# Altium footprint library con-samtec.PCBLIB: 805 footprints (part 25 of 55)
Each footprint in its own frame and in the unit in brackets; x right, y up, seen from the top. Pads: shape width x height; smd on the part's side, far side on the other; paste and mask are expansions set on the pad; w line width, h text height; cw(c..) or ccw(c..) is an arc to the next point about the centre after c.
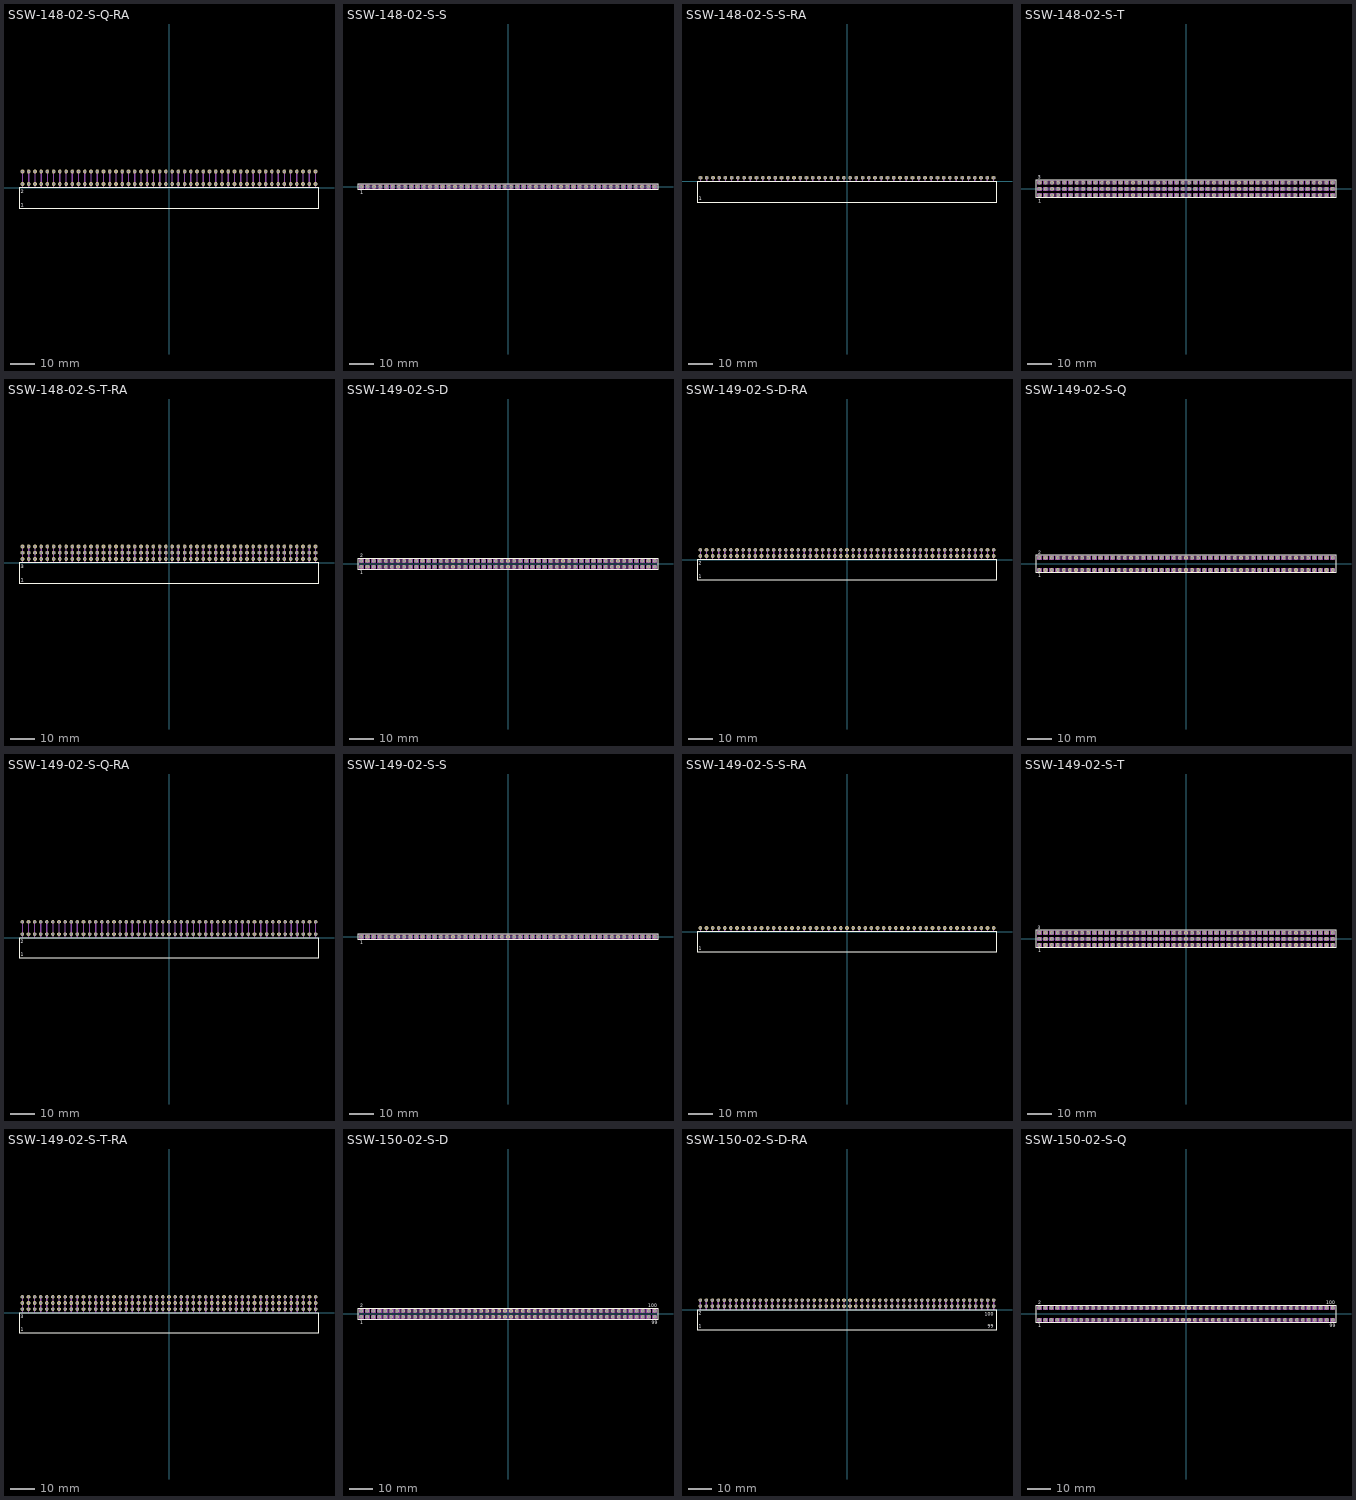
[diagram p24: the footprints below, top view; thin cyan lines are the x and y axes]

## SSW-148-02-S-Q-RA [mil]
pads (96):
  oct 59.06x59.06 hole 39.37: 1(-2350,60) 2(-2350,260) 3(-2250,60) 4(-2250,260) 5(-2150,60) 6(-2150,260) 7(-2050,60) 8(-2050,260) 9(-1950,60) 10(-1950,260) 11(-1850,60) 12(-1850,260) 13(-1750,60) 14(-1750,260) 15(-1650,60) 16(-1650,260) 17(-1550,60) 18(-1550,260) 19(-1450,60) 20(-1450,260) 21(-1350,60) 22(-1350,260) 23(-1250,60) 24(-1250,260) 25(-1150,60) 26(-1150,260) 27(-1050,60) 28(-1050,260) 29(-950,60) 30(-950,260) 31(-850,60) 32(-850,260) 33(-750,60) 34(-750,260) 35(-650,60) 36(-650,260) 37(-550,60) 38(-550,260) 39(-450,60) 40(-450,260) 41(-350,60) 42(-350,260) 43(-250,60) 44(-250,260) 45(-150,60) 46(-150,260) 47(-50,60) 48(-50,260) 49(50,60) 50(50,260) 51(150,60) 52(150,260) 53(250,60) 54(250,260) 55(350,60) 56(350,260) 57(450,60) 58(450,260) 59(550,60) 60(550,260) 61(650,60) 62(650,260) 63(750,60) 64(750,260) 65(850,60) 66(850,260) 67(950,60) 68(950,260) 69(1050,60) 70(1050,260) 71(1150,60) 72(1150,260) 73(1250,60) 74(1250,260) 75(1350,60) 76(1350,260) 77(1450,60) 78(1450,260) 79(1550,60) 80(1550,260) 81(1650,60) 82(1650,260) 83(1750,60) 84(1750,260) 85(1850,60) 86(1850,260) 87(1950,60) 88(1950,260) 89(2050,60) 90(2050,260) 91(2150,60) 92(2150,260) 93(2250,60) 94(2250,260) 95(2350,60) 96(2350,260)
Top Overlay:
  lines w8: -2405.08,-330.55 2405.08,-330.55 2405.08,-4.17 -2405.08,-4.17 -2405.08,-330.55
  text "1" at -2373.43,-301.18 h56.1
  text "2" at -2376.38,-86.61 h56.1
Mechanical 16:
  rectangle: -2360,0 -2340,270
  rectangle: -2260,0 -2240,270
  rectangle: -2160,0 -2140,270
  rectangle: -2060,0 -2040,270
  rectangle: -1960,0 -1940,270
  rectangle: -1860,0 -1840,270
  rectangle: -1760,0 -1740,270
  rectangle: -1660,0 -1640,270
  rectangle: -1560,0 -1540,270
  rectangle: -1460,0 -1440,270
  rectangle: -1360,0 -1340,270
  rectangle: -1260,0 -1240,270
  rectangle: -1160,0 -1140,270
  rectangle: -1060,0 -1040,270
  rectangle: -960,0 -940,270
  rectangle: -860,0 -840,270
  rectangle: -760,0 -740,270
  rectangle: -660,0 -640,270
  rectangle: -560,0 -540,270
  rectangle: -460,0 -440,270
  rectangle: -360,0 -340,270
  rectangle: -260,0 -240,270
  rectangle: -160,0 -140,270
  rectangle: -60,0 -40,270
  rectangle: 40,0 60,270
  rectangle: 140,0 160,270
  rectangle: 240,0 260,270
  rectangle: 340,0 360,270
  rectangle: 440,0 460,270
  rectangle: 540,0 560,270
  rectangle: 640,0 660,270
  rectangle: 740,0 760,270
  rectangle: 840,0 860,270
  rectangle: 940,0 960,270
  rectangle: 1040,0 1060,270
  rectangle: 1140,0 1160,270
  rectangle: 1240,0 1260,270
  rectangle: 1340,0 1360,270
  rectangle: 1440,0 1460,270
  rectangle: 1540,0 1560,270
  rectangle: 1640,0 1660,270
  rectangle: 1740,0 1760,270
  rectangle: 1840,0 1860,270
  rectangle: 1940,0 1960,270
  rectangle: 2040,0 2060,270
  rectangle: 2140,0 2160,270
  rectangle: 2240,0 2260,270
  rectangle: 2340,0 2360,270

## SSW-148-02-S-S [mm]
pads (48):
  oct 1.5x1.5 hole 1: 1(-59.69,0) 2(-57.15,0) 3(-54.61,0) 4(-52.07,0) 5(-49.53,0) 6(-46.99,0) 7(-44.45,0) 8(-41.91,0) 9(-39.37,0) 10(-36.83,0) 11(-34.29,0) 12(-31.75,0) 13(-29.21,0) 14(-26.67,0) 15(-24.13,0) 16(-21.59,0) 17(-19.05,0) 18(-16.51,0) 19(-13.97,0) 20(-11.43,0) 21(-8.89,0) 22(-6.35,0) 23(-3.81,0) 24(-1.27,0) 25(1.27,0) 26(3.81,0) 27(6.35,0) 28(8.89,0) 29(11.43,0) 30(13.97,0) 31(16.51,0) 32(19.05,0) 33(21.59,0) 34(24.13,0) 35(26.67,0) 36(29.21,0) 37(31.75,0) 38(34.29,0) 39(36.83,0) 40(39.37,0) 41(41.91,0) 42(44.45,0) 43(46.99,0) 44(49.53,0) 45(52.07,0) 46(54.61,0) 47(57.15,0) 48(59.69,0)
Top Overlay:
  lines w0.203: -61.089,-1.155 61.089,-1.155 61.089,1.155 -61.089,1.155 -61.089,-1.155
  text "1" at -60.198,-3.048 h1.42
Mechanical 16:
  drawing of 192 lines, arcs and shapes, not listed

## SSW-148-02-S-S-RA [mil]
pads (48):
  oct 59.06x59.06 hole 39.37: 1(-2350,60) 2(-2250,60) 3(-2150,60) 4(-2050,60) 5(-1950,60) 6(-1850,60) 7(-1750,60) 8(-1650,60) 9(-1550,60) 10(-1450,60) 11(-1350,60) 12(-1250,60) 13(-1150,60) 14(-1050,60) 15(-950,60) 16(-850,60) 17(-750,60) 18(-650,60) 19(-550,60) 20(-450,60) 21(-350,60) 22(-250,60) 23(-150,60) 24(-50,60) 25(50,60) 26(150,60) 27(250,60) 28(350,60) 29(450,60) 30(550,60) 31(650,60) 32(750,60) 33(850,60) 34(950,60) 35(1050,60) 36(1150,60) 37(1250,60) 38(1350,60) 39(1450,60) 40(1550,60) 41(1650,60) 42(1750,60) 43(1850,60) 44(1950,60) 45(2050,60) 46(2150,60) 47(2250,60) 48(2350,60)
Top Overlay:
  lines w8: -2405.08,-330.55 2405.08,-330.55 2405.08,-4.17 -2405.08,-4.17 -2405.08,-330.55
  text "1" at -2373.43,-301.18 h56.1
Mechanical 16:
  rectangle: -2360,0 -2340,70
  rectangle: -2260,0 -2240,70
  rectangle: -2160,0 -2140,70
  rectangle: -2060,0 -2040,70
  rectangle: -1960,0 -1940,70
  rectangle: -1860,0 -1840,70
  rectangle: -1760,0 -1740,70
  rectangle: -1660,0 -1640,70
  rectangle: -1560,0 -1540,70
  rectangle: -1460,0 -1440,70
  rectangle: -1360,0 -1340,70
  rectangle: -1260,0 -1240,70
  rectangle: -1160,0 -1140,70
  rectangle: -1060,0 -1040,70
  rectangle: -960,0 -940,70
  rectangle: -860,0 -840,70
  rectangle: -760,0 -740,70
  rectangle: -660,0 -640,70
  rectangle: -560,0 -540,70
  rectangle: -460,0 -440,70
  rectangle: -360,0 -340,70
  rectangle: -260,0 -240,70
  rectangle: -160,0 -140,70
  rectangle: -60,0 -40,70
  rectangle: 40,0 60,70
  rectangle: 140,0 160,70
  rectangle: 240,0 260,70
  rectangle: 340,0 360,70
  rectangle: 440,0 460,70
  rectangle: 540,0 560,70
  rectangle: 640,0 660,70
  rectangle: 740,0 760,70
  rectangle: 840,0 860,70
  rectangle: 940,0 960,70
  rectangle: 1040,0 1060,70
  rectangle: 1140,0 1160,70
  rectangle: 1240,0 1260,70
  rectangle: 1340,0 1360,70
  rectangle: 1440,0 1460,70
  rectangle: 1540,0 1560,70
  rectangle: 1640,0 1660,70
  rectangle: 1740,0 1760,70
  rectangle: 1840,0 1860,70
  rectangle: 1940,0 1960,70
  rectangle: 2040,0 2060,70
  rectangle: 2140,0 2160,70
  rectangle: 2240,0 2260,70
  rectangle: 2340,0 2360,70

## SSW-148-02-S-T [mm]
pads (144):
  oct 1.5x1.5 hole 1: 1(-59.69,-2.54) 2(-59.69,0) 3(-59.69,2.54) 4(-57.15,-2.54) 5(-57.15,0) 6(-57.15,2.54) 7(-54.61,-2.54) 8(-54.61,0) 9(-54.61,2.54) 10(-52.07,-2.54) 11(-52.07,0) 12(-52.07,2.54) 13(-49.53,-2.54) 14(-49.53,0) 15(-49.53,2.54) 16(-46.99,-2.54) 17(-46.99,0) 18(-46.99,2.54) 19(-44.45,-2.54) 20(-44.45,0) 21(-44.45,2.54) 22(-41.91,-2.54) 23(-41.91,0) 24(-41.91,2.54) 25(-39.37,-2.54) 26(-39.37,0) 27(-39.37,2.54) 28(-36.83,-2.54) 29(-36.83,0) 30(-36.83,2.54) 31(-34.29,-2.54) 32(-34.29,0) 33(-34.29,2.54) 34(-31.75,-2.54) 35(-31.75,0) 36(-31.75,2.54) 37(-29.21,-2.54) 38(-29.21,0) 39(-29.21,2.54) 40(-26.67,-2.54) 41(-26.67,0) 42(-26.67,2.54) 43(-24.13,-2.54) 44(-24.13,0) 45(-24.13,2.54) 46(-21.59,-2.54) 47(-21.59,0) 48(-21.59,2.54) 49(-19.05,-2.54) 50(-19.05,0) 51(-19.05,2.54) 52(-16.51,-2.54) 53(-16.51,0) 54(-16.51,2.54) 55(-13.97,-2.54) 56(-13.97,0) 57(-13.97,2.54) 58(-11.43,-2.54) 59(-11.43,0) 60(-11.43,2.54) 61(-8.89,-2.54) 62(-8.89,0) 63(-8.89,2.54) 64(-6.35,-2.54) 65(-6.35,0) 66(-6.35,2.54) 67(-3.81,-2.54) 68(-3.81,0) 69(-3.81,2.54) 70(-1.27,-2.54) 71(-1.27,0) 72(-1.27,2.54) 73(1.27,-2.54) 74(1.27,0) 75(1.27,2.54) 76(3.81,-2.54) 77(3.81,0) 78(3.81,2.54) 79(6.35,-2.54) 80(6.35,0) 81(6.35,2.54) 82(8.89,-2.54) 83(8.89,0) 84(8.89,2.54) 85(11.43,-2.54) 86(11.43,0) 87(11.43,2.54) 88(13.97,-2.54) 89(13.97,0) 90(13.97,2.54) 91(16.51,-2.54) 92(16.51,0) 93(16.51,2.54) 94(19.05,-2.54) 95(19.05,0) 96(19.05,2.54) 97(21.59,-2.54) 98(21.59,0) 99(21.59,2.54) 100(24.13,-2.54) 101(24.13,0) 102(24.13,2.54) 103(26.67,-2.54) 104(26.67,0) 105(26.67,2.54) 106(29.21,-2.54) 107(29.21,0) 108(29.21,2.54) 109(31.75,-2.54) 110(31.75,0) 111(31.75,2.54) 112(34.29,-2.54) 113(34.29,0) 114(34.29,2.54) 115(36.83,-2.54) 116(36.83,0) 117(36.83,2.54) 118(39.37,-2.54) 119(39.37,0) 120(39.37,2.54) 121(41.91,-2.54) 122(41.91,0) 123(41.91,2.54) 124(44.45,-2.54) 125(44.45,0) 126(44.45,2.54) 127(46.99,-2.54) 128(46.99,0) 129(46.99,2.54) 130(49.53,-2.54) 131(49.53,0) 132(49.53,2.54) 133(52.07,-2.54) 134(52.07,0) 135(52.07,2.54) 136(54.61,-2.54) 137(54.61,0) 138(54.61,2.54) 139(57.15,-2.54) 140(57.15,0) 141(57.15,2.54) 142(59.69,-2.54) 143(59.69,0) 144(59.69,2.54)
Top Overlay:
  lines w0.203: -61.089,-3.695 61.089,-3.695 61.089,3.695 -61.089,3.695 -61.089,-3.695
  text "1" at -60.198,-5.588 h1.42
  text "3" at -60.452,4.064 h1.42
Mechanical 16:
  drawing of 576 lines, arcs and shapes, not listed

## SSW-148-02-S-T-RA [mil]
pads (144):
  oct 59.06x59.06 hole 39.37: 1(-2350,60) 2(-2350,160) 3(-2350,260) 4(-2250,60) 5(-2250,160) 6(-2250,260) 7(-2150,60) 8(-2150,160) 9(-2150,260) 10(-2050,60) 11(-2050,160) 12(-2050,260) 13(-1950,60) 14(-1950,160) 15(-1950,260) 16(-1850,60) 17(-1850,160) 18(-1850,260) 19(-1750,60) 20(-1750,160) 21(-1750,260) 22(-1650,60) 23(-1650,160) 24(-1650,260) 25(-1550,60) 26(-1550,160) 27(-1550,260) 28(-1450,60) 29(-1450,160) 30(-1450,260) 31(-1350,60) 32(-1350,160) 33(-1350,260) 34(-1250,60) 35(-1250,160) 36(-1250,260) 37(-1150,60) 38(-1150,160) 39(-1150,260) 40(-1050,60) 41(-1050,160) 42(-1050,260) 43(-950,60) 44(-950,160) 45(-950,260) 46(-850,60) 47(-850,160) 48(-850,260) 49(-750,60) 50(-750,160) 51(-750,260) 52(-650,60) 53(-650,160) 54(-650,260) 55(-550,60) 56(-550,160) 57(-550,260) 58(-450,60) 59(-450,160) 60(-450,260) 61(-350,60) 62(-350,160) 63(-350,260) 64(-250,60) 65(-250,160) 66(-250,260) 67(-150,60) 68(-150,160) 69(-150,260) 70(-50,60) 71(-50,160) 72(-50,260) 73(50,60) 74(50,160) 75(50,260) 76(150,60) 77(150,160) 78(150,260) 79(250,60) 80(250,160) 81(250,260) 82(350,60) 83(350,160) 84(350,260) 85(450,60) 86(450,160) 87(450,260) 88(550,60) 89(550,160) 90(550,260) 91(650,60) 92(650,160) 93(650,260) 94(750,60) 95(750,160) 96(750,260) 97(850,60) 98(850,160) 99(850,260) 100(950,60) 101(950,160) 102(950,260) 103(1050,60) 104(1050,160) 105(1050,260) 106(1150,60) 107(1150,160) 108(1150,260) 109(1250,60) 110(1250,160) 111(1250,260) 112(1350,60) 113(1350,160) 114(1350,260) 115(1450,60) 116(1450,160) 117(1450,260) 118(1550,60) 119(1550,160) 120(1550,260) 121(1650,60) 122(1650,160) 123(1650,260) 124(1750,60) 125(1750,160) 126(1750,260) 127(1850,60) 128(1850,160) 129(1850,260) 130(1950,60) 131(1950,160) 132(1950,260) 133(2050,60) 134(2050,160) 135(2050,260) 136(2150,60) 137(2150,160) 138(2150,260) 139(2250,60) 140(2250,160) 141(2250,260) 142(2350,60) 143(2350,160) 144(2350,260)
Top Overlay:
  lines w8: -2405.08,-330.55 2405.08,-330.55 2405.08,-4.17 -2405.08,-4.17 -2405.08,-330.55
  text "1" at -2373.43,-301.18 h56.1
  text "3" at -2376.38,-86.61 h56.1
Mechanical 16:
  rectangle: -2360,0 -2340,270
  rectangle: -2260,0 -2240,270
  rectangle: -2160,0 -2140,270
  rectangle: -2060,0 -2040,270
  rectangle: -1960,0 -1940,270
  rectangle: -1860,0 -1840,270
  rectangle: -1760,0 -1740,270
  rectangle: -1660,0 -1640,270
  rectangle: -1560,0 -1540,270
  rectangle: -1460,0 -1440,270
  rectangle: -1360,0 -1340,270
  rectangle: -1260,0 -1240,270
  rectangle: -1160,0 -1140,270
  rectangle: -1060,0 -1040,270
  rectangle: -960,0 -940,270
  rectangle: -860,0 -840,270
  rectangle: -760,0 -740,270
  rectangle: -660,0 -640,270
  rectangle: -560,0 -540,270
  rectangle: -460,0 -440,270
  rectangle: -360,0 -340,270
  rectangle: -260,0 -240,270
  rectangle: -160,0 -140,270
  rectangle: -60,0 -40,270
  rectangle: 40,0 60,270
  rectangle: 140,0 160,270
  rectangle: 240,0 260,270
  rectangle: 340,0 360,270
  rectangle: 440,0 460,270
  rectangle: 540,0 560,270
  rectangle: 640,0 660,270
  rectangle: 740,0 760,270
  rectangle: 840,0 860,270
  rectangle: 940,0 960,270
  rectangle: 1040,0 1060,270
  rectangle: 1140,0 1160,270
  rectangle: 1240,0 1260,270
  rectangle: 1340,0 1360,270
  rectangle: 1440,0 1460,270
  rectangle: 1540,0 1560,270
  rectangle: 1640,0 1660,270
  rectangle: 1740,0 1760,270
  rectangle: 1840,0 1860,270
  rectangle: 1940,0 1960,270
  rectangle: 2040,0 2060,270
  rectangle: 2140,0 2160,270
  rectangle: 2240,0 2260,270
  rectangle: 2340,0 2360,270

## SSW-149-02-S-D [mm]
pads (98):
  oct 1.5x1.5 hole 1: 1(-60.96,-1.27) 2(-60.96,1.27) 3(-58.42,-1.27) 4(-58.42,1.27) 5(-55.88,-1.27) 6(-55.88,1.27) 7(-53.34,-1.27) 8(-53.34,1.27) 9(-50.8,-1.27) 10(-50.8,1.27) 11(-48.26,-1.27) 12(-48.26,1.27) 13(-45.72,-1.27) 14(-45.72,1.27) 15(-43.18,-1.27) 16(-43.18,1.27) 17(-40.64,-1.27) 18(-40.64,1.27) 19(-38.1,-1.27) 20(-38.1,1.27) 21(-35.56,-1.27) 22(-35.56,1.27) 23(-33.02,-1.27) 24(-33.02,1.27) 25(-30.48,-1.27) 26(-30.48,1.27) 27(-27.94,-1.27) 28(-27.94,1.27) 29(-25.4,-1.27) 30(-25.4,1.27) 31(-22.86,-1.27) 32(-22.86,1.27) 33(-20.32,-1.27) 34(-20.32,1.27) 35(-17.78,-1.27) 36(-17.78,1.27) 37(-15.24,-1.27) 38(-15.24,1.27) 39(-12.7,-1.27) 40(-12.7,1.27) 41(-10.16,-1.27) 42(-10.16,1.27) 43(-7.62,-1.27) 44(-7.62,1.27) 45(-5.08,-1.27) 46(-5.08,1.27) 47(-2.54,-1.27) 48(-2.54,1.27) 49(0,-1.27) 50(0,1.27) 51(2.54,-1.27) 52(2.54,1.27) 53(5.08,-1.27) 54(5.08,1.27) 55(7.62,-1.27) 56(7.62,1.27) 57(10.16,-1.27) 58(10.16,1.27) 59(12.7,-1.27) 60(12.7,1.27) 61(15.24,-1.27) 62(15.24,1.27) 63(17.78,-1.27) 64(17.78,1.27) 65(20.32,-1.27) 66(20.32,1.27) 67(22.86,-1.27) 68(22.86,1.27) 69(25.4,-1.27) 70(25.4,1.27) 71(27.94,-1.27) 72(27.94,1.27) 73(30.48,-1.27) 74(30.48,1.27) 75(33.02,-1.27) 76(33.02,1.27) 77(35.56,-1.27) 78(35.56,1.27) 79(38.1,-1.27) 80(38.1,1.27) 81(40.64,-1.27) 82(40.64,1.27) 83(43.18,-1.27) 84(43.18,1.27) 85(45.72,-1.27) 86(45.72,1.27) 87(48.26,-1.27) 88(48.26,1.27) 89(50.8,-1.27) 90(50.8,1.27) 91(53.34,-1.27) 92(53.34,1.27) 93(55.88,-1.27) 94(55.88,1.27) 95(58.42,-1.27) 96(58.42,1.27) 97(60.96,-1.27) 98(60.96,1.27)
Top Overlay:
  lines w0.203: -62.359,-2.425 62.359,-2.425 62.359,2.425 -62.359,2.425 -62.359,-2.425
  text "1" at -61.468,-4.318 h1.42
  text "2" at -61.468,2.794 h1.42
Mechanical 16:
  drawing of 392 lines, arcs and shapes, not listed

## SSW-149-02-S-D-RA [mil]
pads (98):
  oct 59.06x59.06 hole 39.37: 1(-2400,60) 2(-2400,160) 3(-2300,60) 4(-2300,160) 5(-2200,60) 6(-2200,160) 7(-2100,60) 8(-2100,160) 9(-2000,60) 10(-2000,160) 11(-1900,60) 12(-1900,160) 13(-1800,60) 14(-1800,160) 15(-1700,60) 16(-1700,160) 17(-1600,60) 18(-1600,160) 19(-1500,60) 20(-1500,160) 21(-1400,60) 22(-1400,160) 23(-1300,60) 24(-1300,160) 25(-1200,60) 26(-1200,160) 27(-1100,60) 28(-1100,160) 29(-1000,60) 30(-1000,160) 31(-900,60) 32(-900,160) 33(-800,60) 34(-800,160) 35(-700,60) 36(-700,160) 37(-600,60) 38(-600,160) 39(-500,60) 40(-500,160) 41(-400,60) 42(-400,160) 43(-300,60) 44(-300,160) 45(-200,60) 46(-200,160) 47(-100,60) 48(-100,160) 49(0,60) 50(0,160) 51(100,60) 52(100,160) 53(200,60) 54(200,160) 55(300,60) 56(300,160) 57(400,60) 58(400,160) 59(500,60) 60(500,160) 61(600,60) 62(600,160) 63(700,60) 64(700,160) 65(800,60) 66(800,160) 67(900,60) 68(900,160) 69(1000,60) 70(1000,160) 71(1100,60) 72(1100,160) 73(1200,60) 74(1200,160) 75(1300,60) 76(1300,160) 77(1400,60) 78(1400,160) 79(1500,60) 80(1500,160) 81(1600,60) 82(1600,160) 83(1700,60) 84(1700,160) 85(1800,60) 86(1800,160) 87(1900,60) 88(1900,160) 89(2000,60) 90(2000,160) 91(2100,60) 92(2100,160) 93(2200,60) 94(2200,160) 95(2300,60) 96(2300,160) 97(2400,60) 98(2400,160)
Top Overlay:
  lines w8: -2455.08,-330.55 2455.08,-330.55 2455.08,-4.17 -2455.08,-4.17 -2455.08,-330.55
  text "1" at -2423.43,-301.18 h56.1
  text "2" at -2426.38,-86.61 h56.1
Mechanical 16:
  rectangle: -2410,0 -2390,170
  rectangle: -2310,0 -2290,170
  rectangle: -2210,0 -2190,170
  rectangle: -2110,0 -2090,170
  rectangle: -2010,0 -1990,170
  rectangle: -1910,0 -1890,170
  rectangle: -1810,0 -1790,170
  rectangle: -1710,0 -1690,170
  rectangle: -1610,0 -1590,170
  rectangle: -1510,0 -1490,170
  rectangle: -1410,0 -1390,170
  rectangle: -1310,0 -1290,170
  rectangle: -1210,0 -1190,170
  rectangle: -1110,0 -1090,170
  rectangle: -1010,0 -990,170
  rectangle: -910,0 -890,170
  rectangle: -810,0 -790,170
  rectangle: -710,0 -690,170
  rectangle: -610,0 -590,170
  rectangle: -510,0 -490,170
  rectangle: -410,0 -390,170
  rectangle: -310,0 -290,170
  rectangle: -210,0 -190,170
  rectangle: -110,0 -90,170
  rectangle: -10,0 10,170
  rectangle: 90,0 110,170
  rectangle: 190,0 210,170
  rectangle: 290,0 310,170
  rectangle: 390,0 410,170
  rectangle: 490,0 510,170
  rectangle: 590,0 610,170
  rectangle: 690,0 710,170
  rectangle: 790,0 810,170
  rectangle: 890,0 910,170
  rectangle: 990,0 1010,170
  rectangle: 1090,0 1110,170
  rectangle: 1190,0 1210,170
  rectangle: 1290,0 1310,170
  rectangle: 1390,0 1410,170
  rectangle: 1490,0 1510,170
  rectangle: 1590,0 1610,170
  rectangle: 1690,0 1710,170
  rectangle: 1790,0 1810,170
  rectangle: 1890,0 1910,170
  rectangle: 1990,0 2010,170
  rectangle: 2090,0 2110,170
  rectangle: 2190,0 2210,170
  rectangle: 2290,0 2310,170
  rectangle: 2390,0 2410,170

## SSW-149-02-S-Q [mm]
pads (98):
  oct 1.5x1.5 hole 1: 1(-60.96,-2.54) 2(-60.96,2.54) 3(-58.42,-2.54) 4(-58.42,2.54) 5(-55.88,-2.54) 6(-55.88,2.54) 7(-53.34,-2.54) 8(-53.34,2.54) 9(-50.8,-2.54) 10(-50.8,2.54) 11(-48.26,-2.54) 12(-48.26,2.54) 13(-45.72,-2.54) 14(-45.72,2.54) 15(-43.18,-2.54) 16(-43.18,2.54) 17(-40.64,-2.54) 18(-40.64,2.54) 19(-38.1,-2.54) 20(-38.1,2.54) 21(-35.56,-2.54) 22(-35.56,2.54) 23(-33.02,-2.54) 24(-33.02,2.54) 25(-30.48,-2.54) 26(-30.48,2.54) 27(-27.94,-2.54) 28(-27.94,2.54) 29(-25.4,-2.54) 30(-25.4,2.54) 31(-22.86,-2.54) 32(-22.86,2.54) 33(-20.32,-2.54) 34(-20.32,2.54) 35(-17.78,-2.54) 36(-17.78,2.54) 37(-15.24,-2.54) 38(-15.24,2.54) 39(-12.7,-2.54) 40(-12.7,2.54) 41(-10.16,-2.54) 42(-10.16,2.54) 43(-7.62,-2.54) 44(-7.62,2.54) 45(-5.08,-2.54) 46(-5.08,2.54) 47(-2.54,-2.54) 48(-2.54,2.54) 49(0,-2.54) 50(0,2.54) 51(2.54,-2.54) 52(2.54,2.54) 53(5.08,-2.54) 54(5.08,2.54) 55(7.62,-2.54) 56(7.62,2.54) 57(10.16,-2.54) 58(10.16,2.54) 59(12.7,-2.54) 60(12.7,2.54) 61(15.24,-2.54) 62(15.24,2.54) 63(17.78,-2.54) 64(17.78,2.54) 65(20.32,-2.54) 66(20.32,2.54) 67(22.86,-2.54) 68(22.86,2.54) 69(25.4,-2.54) 70(25.4,2.54) 71(27.94,-2.54) 72(27.94,2.54) 73(30.48,-2.54) 74(30.48,2.54) 75(33.02,-2.54) 76(33.02,2.54) 77(35.56,-2.54) 78(35.56,2.54) 79(38.1,-2.54) 80(38.1,2.54) 81(40.64,-2.54) 82(40.64,2.54) 83(43.18,-2.54) 84(43.18,2.54) 85(45.72,-2.54) 86(45.72,2.54) 87(48.26,-2.54) 88(48.26,2.54) 89(50.8,-2.54) 90(50.8,2.54) 91(53.34,-2.54) 92(53.34,2.54) 93(55.88,-2.54) 94(55.88,2.54) 95(58.42,-2.54) 96(58.42,2.54) 97(60.96,-2.54) 98(60.96,2.54)
Top Overlay:
  lines w0.203: -62.359,-3.695 62.359,-3.695 62.359,3.695 -62.359,3.695 -62.359,-3.695
  text "1" at -61.468,-5.588 h1.42
  text "2" at -61.468,4.064 h1.42
Mechanical 16:
  drawing of 392 lines, arcs and shapes, not listed

## SSW-149-02-S-Q-RA [mil]
pads (98):
  oct 59.06x59.06 hole 39.37: 1(-2400,60) 2(-2400,260) 3(-2300,60) 4(-2300,260) 5(-2200,60) 6(-2200,260) 7(-2100,60) 8(-2100,260) 9(-2000,60) 10(-2000,260) 11(-1900,60) 12(-1900,260) 13(-1800,60) 14(-1800,260) 15(-1700,60) 16(-1700,260) 17(-1600,60) 18(-1600,260) 19(-1500,60) 20(-1500,260) 21(-1400,60) 22(-1400,260) 23(-1300,60) 24(-1300,260) 25(-1200,60) 26(-1200,260) 27(-1100,60) 28(-1100,260) 29(-1000,60) 30(-1000,260) 31(-900,60) 32(-900,260) 33(-800,60) 34(-800,260) 35(-700,60) 36(-700,260) 37(-600,60) 38(-600,260) 39(-500,60) 40(-500,260) 41(-400,60) 42(-400,260) 43(-300,60) 44(-300,260) 45(-200,60) 46(-200,260) 47(-100,60) 48(-100,260) 49(0,60) 50(0,260) 51(100,60) 52(100,260) 53(200,60) 54(200,260) 55(300,60) 56(300,260) 57(400,60) 58(400,260) 59(500,60) 60(500,260) 61(600,60) 62(600,260) 63(700,60) 64(700,260) 65(800,60) 66(800,260) 67(900,60) 68(900,260) 69(1000,60) 70(1000,260) 71(1100,60) 72(1100,260) 73(1200,60) 74(1200,260) 75(1300,60) 76(1300,260) 77(1400,60) 78(1400,260) 79(1500,60) 80(1500,260) 81(1600,60) 82(1600,260) 83(1700,60) 84(1700,260) 85(1800,60) 86(1800,260) 87(1900,60) 88(1900,260) 89(2000,60) 90(2000,260) 91(2100,60) 92(2100,260) 93(2200,60) 94(2200,260) 95(2300,60) 96(2300,260) 97(2400,60) 98(2400,260)
Top Overlay:
  lines w8: -2455.08,-330.55 2455.08,-330.55 2455.08,-4.17 -2455.08,-4.17 -2455.08,-330.55
  text "1" at -2423.43,-301.18 h56.1
  text "2" at -2426.38,-86.61 h56.1
Mechanical 16:
  rectangle: -2410,0 -2390,270
  rectangle: -2310,0 -2290,270
  rectangle: -2210,0 -2190,270
  rectangle: -2110,0 -2090,270
  rectangle: -2010,0 -1990,270
  rectangle: -1910,0 -1890,270
  rectangle: -1810,0 -1790,270
  rectangle: -1710,0 -1690,270
  rectangle: -1610,0 -1590,270
  rectangle: -1510,0 -1490,270
  rectangle: -1410,0 -1390,270
  rectangle: -1310,0 -1290,270
  rectangle: -1210,0 -1190,270
  rectangle: -1110,0 -1090,270
  rectangle: -1010,0 -990,270
  rectangle: -910,0 -890,270
  rectangle: -810,0 -790,270
  rectangle: -710,0 -690,270
  rectangle: -610,0 -590,270
  rectangle: -510,0 -490,270
  rectangle: -410,0 -390,270
  rectangle: -310,0 -290,270
  rectangle: -210,0 -190,270
  rectangle: -110,0 -90,270
  rectangle: -10,0 10,270
  rectangle: 90,0 110,270
  rectangle: 190,0 210,270
  rectangle: 290,0 310,270
  rectangle: 390,0 410,270
  rectangle: 490,0 510,270
  rectangle: 590,0 610,270
  rectangle: 690,0 710,270
  rectangle: 790,0 810,270
  rectangle: 890,0 910,270
  rectangle: 990,0 1010,270
  rectangle: 1090,0 1110,270
  rectangle: 1190,0 1210,270
  rectangle: 1290,0 1310,270
  rectangle: 1390,0 1410,270
  rectangle: 1490,0 1510,270
  rectangle: 1590,0 1610,270
  rectangle: 1690,0 1710,270
  rectangle: 1790,0 1810,270
  rectangle: 1890,0 1910,270
  rectangle: 1990,0 2010,270
  rectangle: 2090,0 2110,270
  rectangle: 2190,0 2210,270
  rectangle: 2290,0 2310,270
  rectangle: 2390,0 2410,270

## SSW-149-02-S-S [mm]
pads (49):
  oct 1.5x1.5 hole 1: 1(-60.96,0) 2(-58.42,0) 3(-55.88,0) 4(-53.34,0) 5(-50.8,0) 6(-48.26,0) 7(-45.72,0) 8(-43.18,0) 9(-40.64,0) 10(-38.1,0) 11(-35.56,0) 12(-33.02,0) 13(-30.48,0) 14(-27.94,0) 15(-25.4,0) 16(-22.86,0) 17(-20.32,0) 18(-17.78,0) 19(-15.24,0) 20(-12.7,0) 21(-10.16,0) 22(-7.62,0) 23(-5.08,0) 24(-2.54,0) 25(0,0) 26(2.54,0) 27(5.08,0) 28(7.62,0) 29(10.16,0) 30(12.7,0) 31(15.24,0) 32(17.78,0) 33(20.32,0) 34(22.86,0) 35(25.4,0) 36(27.94,0) 37(30.48,0) 38(33.02,0) 39(35.56,0) 40(38.1,0) 41(40.64,0) 42(43.18,0) 43(45.72,0) 44(48.26,0) 45(50.8,0) 46(53.34,0) 47(55.88,0) 48(58.42,0) 49(60.96,0)
Top Overlay:
  lines w0.203: -62.359,-1.155 62.359,-1.155 62.359,1.155 -62.359,1.155 -62.359,-1.155
  text "1" at -61.468,-3.048 h1.42
Mechanical 16:
  drawing of 196 lines, arcs and shapes, not listed

## SSW-149-02-S-S-RA [mil]
pads (49):
  oct 59.06x59.06 hole 39.37: 1(-2400,60) 2(-2300,60) 3(-2200,60) 4(-2100,60) 5(-2000,60) 6(-1900,60) 7(-1800,60) 8(-1700,60) 9(-1600,60) 10(-1500,60) 11(-1400,60) 12(-1300,60) 13(-1200,60) 14(-1100,60) 15(-1000,60) 16(-900,60) 17(-800,60) 18(-700,60) 19(-600,60) 20(-500,60) 21(-400,60) 22(-300,60) 23(-200,60) 24(-100,60) 25(0,60) 26(100,60) 27(200,60) 28(300,60) 29(400,60) 30(500,60) 31(600,60) 32(700,60) 33(800,60) 34(900,60) 35(1000,60) 36(1100,60) 37(1200,60) 38(1300,60) 39(1400,60) 40(1500,60) 41(1600,60) 42(1700,60) 43(1800,60) 44(1900,60) 45(2000,60) 46(2100,60) 47(2200,60) 48(2300,60) 49(2400,60)
Top Overlay:
  lines w8: -2455.08,-330.55 2455.08,-330.55 2455.08,-4.17 -2455.08,-4.17 -2455.08,-330.55
  text "1" at -2423.43,-301.18 h56.1
Mechanical 16:
  rectangle: -2410,0 -2390,70
  rectangle: -2310,0 -2290,70
  rectangle: -2210,0 -2190,70
  rectangle: -2110,0 -2090,70
  rectangle: -2010,0 -1990,70
  rectangle: -1910,0 -1890,70
  rectangle: -1810,0 -1790,70
  rectangle: -1710,0 -1690,70
  rectangle: -1610,0 -1590,70
  rectangle: -1510,0 -1490,70
  rectangle: -1410,0 -1390,70
  rectangle: -1310,0 -1290,70
  rectangle: -1210,0 -1190,70
  rectangle: -1110,0 -1090,70
  rectangle: -1010,0 -990,70
  rectangle: -910,0 -890,70
  rectangle: -810,0 -790,70
  rectangle: -710,0 -690,70
  rectangle: -610,0 -590,70
  rectangle: -510,0 -490,70
  rectangle: -410,0 -390,70
  rectangle: -310,0 -290,70
  rectangle: -210,0 -190,70
  rectangle: -110,0 -90,70
  rectangle: -10,0 10,70
  rectangle: 90,0 110,70
  rectangle: 190,0 210,70
  rectangle: 290,0 310,70
  rectangle: 390,0 410,70
  rectangle: 490,0 510,70
  rectangle: 590,0 610,70
  rectangle: 690,0 710,70
  rectangle: 790,0 810,70
  rectangle: 890,0 910,70
  rectangle: 990,0 1010,70
  rectangle: 1090,0 1110,70
  rectangle: 1190,0 1210,70
  rectangle: 1290,0 1310,70
  rectangle: 1390,0 1410,70
  rectangle: 1490,0 1510,70
  rectangle: 1590,0 1610,70
  rectangle: 1690,0 1710,70
  rectangle: 1790,0 1810,70
  rectangle: 1890,0 1910,70
  rectangle: 1990,0 2010,70
  rectangle: 2090,0 2110,70
  rectangle: 2190,0 2210,70
  rectangle: 2290,0 2310,70
  rectangle: 2390,0 2410,70

## SSW-149-02-S-T [mm]
pads (147):
  oct 1.5x1.5 hole 1: 1(-60.96,-2.54) 2(-60.96,0) 3(-60.96,2.54) 4(-58.42,-2.54) 5(-58.42,0) 6(-58.42,2.54) 7(-55.88,-2.54) 8(-55.88,0) 9(-55.88,2.54) 10(-53.34,-2.54) 11(-53.34,0) 12(-53.34,2.54) 13(-50.8,-2.54) 14(-50.8,0) 15(-50.8,2.54) 16(-48.26,-2.54) 17(-48.26,0) 18(-48.26,2.54) 19(-45.72,-2.54) 20(-45.72,0) 21(-45.72,2.54) 22(-43.18,-2.54) 23(-43.18,0) 24(-43.18,2.54) 25(-40.64,-2.54) 26(-40.64,0) 27(-40.64,2.54) 28(-38.1,-2.54) 29(-38.1,0) 30(-38.1,2.54) 31(-35.56,-2.54) 32(-35.56,0) 33(-35.56,2.54) 34(-33.02,-2.54) 35(-33.02,0) 36(-33.02,2.54) 37(-30.48,-2.54) 38(-30.48,0) 39(-30.48,2.54) 40(-27.94,-2.54) 41(-27.94,0) 42(-27.94,2.54) 43(-25.4,-2.54) 44(-25.4,0) 45(-25.4,2.54) 46(-22.86,-2.54) 47(-22.86,0) 48(-22.86,2.54) 49(-20.32,-2.54) 50(-20.32,0) 51(-20.32,2.54) 52(-17.78,-2.54) 53(-17.78,0) 54(-17.78,2.54) 55(-15.24,-2.54) 56(-15.24,0) 57(-15.24,2.54) 58(-12.7,-2.54) 59(-12.7,0) 60(-12.7,2.54) 61(-10.16,-2.54) 62(-10.16,0) 63(-10.16,2.54) 64(-7.62,-2.54) 65(-7.62,0) 66(-7.62,2.54) 67(-5.08,-2.54) 68(-5.08,0) 69(-5.08,2.54) 70(-2.54,-2.54) 71(-2.54,0) 72(-2.54,2.54) 73(0,-2.54) 74(0,0) 75(0,2.54) 76(2.54,-2.54) 77(2.54,0) 78(2.54,2.54) 79(5.08,-2.54) 80(5.08,0) 81(5.08,2.54) 82(7.62,-2.54) 83(7.62,0) 84(7.62,2.54) 85(10.16,-2.54) 86(10.16,0) 87(10.16,2.54) 88(12.7,-2.54) 89(12.7,0) 90(12.7,2.54) 91(15.24,-2.54) 92(15.24,0) 93(15.24,2.54) 94(17.78,-2.54) 95(17.78,0) 96(17.78,2.54) 97(20.32,-2.54) 98(20.32,0) 99(20.32,2.54) 100(22.86,-2.54) 101(22.86,0) 102(22.86,2.54) 103(25.4,-2.54) 104(25.4,0) 105(25.4,2.54) 106(27.94,-2.54) 107(27.94,0) 108(27.94,2.54) 109(30.48,-2.54) 110(30.48,0) 111(30.48,2.54) 112(33.02,-2.54) 113(33.02,0) 114(33.02,2.54) 115(35.56,-2.54) 116(35.56,0) 117(35.56,2.54) 118(38.1,-2.54) 119(38.1,0) 120(38.1,2.54) 121(40.64,-2.54) 122(40.64,0) 123(40.64,2.54) 124(43.18,-2.54) 125(43.18,0) 126(43.18,2.54) 127(45.72,-2.54) 128(45.72,0) 129(45.72,2.54) 130(48.26,-2.54) 131(48.26,0) 132(48.26,2.54) 133(50.8,-2.54) 134(50.8,0) 135(50.8,2.54) 136(53.34,-2.54) 137(53.34,0) 138(53.34,2.54) 139(55.88,-2.54) 140(55.88,0) 141(55.88,2.54) 142(58.42,-2.54) 143(58.42,0) 144(58.42,2.54) 145(60.96,-2.54) 146(60.96,0) 147(60.96,2.54)
Top Overlay:
  lines w0.203: -62.359,-3.695 62.359,-3.695 62.359,3.695 -62.359,3.695 -62.359,-3.695
  text "1" at -61.468,-5.588 h1.42
  text "3" at -61.722,4.064 h1.42
Mechanical 16:
  drawing of 588 lines, arcs and shapes, not listed

## SSW-149-02-S-T-RA [mil]
pads (147):
  oct 59.06x59.06 hole 39.37: 1(-2400,60) 2(-2400,160) 3(-2400,260) 4(-2300,60) 5(-2300,160) 6(-2300,260) 7(-2200,60) 8(-2200,160) 9(-2200,260) 10(-2100,60) 11(-2100,160) 12(-2100,260) 13(-2000,60) 14(-2000,160) 15(-2000,260) 16(-1900,60) 17(-1900,160) 18(-1900,260) 19(-1800,60) 20(-1800,160) 21(-1800,260) 22(-1700,60) 23(-1700,160) 24(-1700,260) 25(-1600,60) 26(-1600,160) 27(-1600,260) 28(-1500,60) 29(-1500,160) 30(-1500,260) 31(-1400,60) 32(-1400,160) 33(-1400,260) 34(-1300,60) 35(-1300,160) 36(-1300,260) 37(-1200,60) 38(-1200,160) 39(-1200,260) 40(-1100,60) 41(-1100,160) 42(-1100,260) 43(-1000,60) 44(-1000,160) 45(-1000,260) 46(-900,60) 47(-900,160) 48(-900,260) 49(-800,60) 50(-800,160) 51(-800,260) 52(-700,60) 53(-700,160) 54(-700,260) 55(-600,60) 56(-600,160) 57(-600,260) 58(-500,60) 59(-500,160) 60(-500,260) 61(-400,60) 62(-400,160) 63(-400,260) 64(-300,60) 65(-300,160) 66(-300,260) 67(-200,60) 68(-200,160) 69(-200,260) 70(-100,60) 71(-100,160) 72(-100,260) 73(0,60) 74(0,160) 75(0,260) 76(100,60) 77(100,160) 78(100,260) 79(200,60) 80(200,160) 81(200,260) 82(300,60) 83(300,160) 84(300,260) 85(400,60) 86(400,160) 87(400,260) 88(500,60) 89(500,160) 90(500,260) 91(600,60) 92(600,160) 93(600,260) 94(700,60) 95(700,160) 96(700,260) 97(800,60) 98(800,160) 99(800,260) 100(900,60) 101(900,160) 102(900,260) 103(1000,60) 104(1000,160) 105(1000,260) 106(1100,60) 107(1100,160) 108(1100,260) 109(1200,60) 110(1200,160) 111(1200,260) 112(1300,60) 113(1300,160) 114(1300,260) 115(1400,60) 116(1400,160) 117(1400,260) 118(1500,60) 119(1500,160) 120(1500,260) 121(1600,60) 122(1600,160) 123(1600,260) 124(1700,60) 125(1700,160) 126(1700,260) 127(1800,60) 128(1800,160) 129(1800,260) 130(1900,60) 131(1900,160) 132(1900,260) 133(2000,60) 134(2000,160) 135(2000,260) 136(2100,60) 137(2100,160) 138(2100,260) 139(2200,60) 140(2200,160) 141(2200,260) 142(2300,60) 143(2300,160) 144(2300,260) 145(2400,60) 146(2400,160) 147(2400,260)
Top Overlay:
  lines w8: -2455.08,-330.55 2455.08,-330.55 2455.08,-4.17 -2455.08,-4.17 -2455.08,-330.55
  text "1" at -2423.43,-301.18 h56.1
  text "3" at -2426.38,-86.61 h56.1
Mechanical 16:
  rectangle: -2410,0 -2390,270
  rectangle: -2310,0 -2290,270
  rectangle: -2210,0 -2190,270
  rectangle: -2110,0 -2090,270
  rectangle: -2010,0 -1990,270
  rectangle: -1910,0 -1890,270
  rectangle: -1810,0 -1790,270
  rectangle: -1710,0 -1690,270
  rectangle: -1610,0 -1590,270
  rectangle: -1510,0 -1490,270
  rectangle: -1410,0 -1390,270
  rectangle: -1310,0 -1290,270
  rectangle: -1210,0 -1190,270
  rectangle: -1110,0 -1090,270
  rectangle: -1010,0 -990,270
  rectangle: -910,0 -890,270
  rectangle: -810,0 -790,270
  rectangle: -710,0 -690,270
  rectangle: -610,0 -590,270
  rectangle: -510,0 -490,270
  rectangle: -410,0 -390,270
  rectangle: -310,0 -290,270
  rectangle: -210,0 -190,270
  rectangle: -110,0 -90,270
  rectangle: -10,0 10,270
  rectangle: 90,0 110,270
  rectangle: 190,0 210,270
  rectangle: 290,0 310,270
  rectangle: 390,0 410,270
  rectangle: 490,0 510,270
  rectangle: 590,0 610,270
  rectangle: 690,0 710,270
  rectangle: 790,0 810,270
  rectangle: 890,0 910,270
  rectangle: 990,0 1010,270
  rectangle: 1090,0 1110,270
  rectangle: 1190,0 1210,270
  rectangle: 1290,0 1310,270
  rectangle: 1390,0 1410,270
  rectangle: 1490,0 1510,270
  rectangle: 1590,0 1610,270
  rectangle: 1690,0 1710,270
  rectangle: 1790,0 1810,270
  rectangle: 1890,0 1910,270
  rectangle: 1990,0 2010,270
  rectangle: 2090,0 2110,270
  rectangle: 2190,0 2210,270
  rectangle: 2290,0 2310,270
  rectangle: 2390,0 2410,270

## SSW-150-02-S-D [mm]
pads (100):
  oct 1.5x1.5 hole 1: 1(-62.23,-1.27) 2(-62.23,1.27) 3(-59.69,-1.27) 4(-59.69,1.27) 5(-57.15,-1.27) 6(-57.15,1.27) 7(-54.61,-1.27) 8(-54.61,1.27) 9(-52.07,-1.27) 10(-52.07,1.27) 11(-49.53,-1.27) 12(-49.53,1.27) 13(-46.99,-1.27) 14(-46.99,1.27) 15(-44.45,-1.27) 16(-44.45,1.27) 17(-41.91,-1.27) 18(-41.91,1.27) 19(-39.37,-1.27) 20(-39.37,1.27) 21(-36.83,-1.27) 22(-36.83,1.27) 23(-34.29,-1.27) 24(-34.29,1.27) 25(-31.75,-1.27) 26(-31.75,1.27) 27(-29.21,-1.27) 28(-29.21,1.27) 29(-26.67,-1.27) 30(-26.67,1.27) 31(-24.13,-1.27) 32(-24.13,1.27) 33(-21.59,-1.27) 34(-21.59,1.27) 35(-19.05,-1.27) 36(-19.05,1.27) 37(-16.51,-1.27) 38(-16.51,1.27) 39(-13.97,-1.27) 40(-13.97,1.27) 41(-11.43,-1.27) 42(-11.43,1.27) 43(-8.89,-1.27) 44(-8.89,1.27) 45(-6.35,-1.27) 46(-6.35,1.27) 47(-3.81,-1.27) 48(-3.81,1.27) 49(-1.27,-1.27) 50(-1.27,1.27) 51(1.27,-1.27) 52(1.27,1.27) 53(3.81,-1.27) 54(3.81,1.27) 55(6.35,-1.27) 56(6.35,1.27) 57(8.89,-1.27) 58(8.89,1.27) 59(11.43,-1.27) 60(11.43,1.27) 61(13.97,-1.27) 62(13.97,1.27) 63(16.51,-1.27) 64(16.51,1.27) 65(19.05,-1.27) 66(19.05,1.27) 67(21.59,-1.27) 68(21.59,1.27) 69(24.13,-1.27) 70(24.13,1.27) 71(26.67,-1.27) 72(26.67,1.27) 73(29.21,-1.27) 74(29.21,1.27) 75(31.75,-1.27) 76(31.75,1.27) 77(34.29,-1.27) 78(34.29,1.27) 79(36.83,-1.27) 80(36.83,1.27) 81(39.37,-1.27) 82(39.37,1.27) 83(41.91,-1.27) 84(41.91,1.27) 85(44.45,-1.27) 86(44.45,1.27) 87(46.99,-1.27) 88(46.99,1.27) 89(49.53,-1.27) 90(49.53,1.27) 91(52.07,-1.27) 92(52.07,1.27) 93(54.61,-1.27) 94(54.61,1.27) 95(57.15,-1.27) 96(57.15,1.27) 97(59.69,-1.27) 98(59.69,1.27) 99(62.23,-1.27) 100(62.23,1.27)
Top Overlay:
  lines w0.203: -63.629,-2.425 63.629,-2.425 63.629,2.425 -63.629,2.425 -63.629,-2.425
  text "1" at -62.738,-4.318 h1.42
  text "2" at -62.738,2.794 h1.42
  text "99" at 60.96,-4.318 h1.42
  text "100" at 59.436,2.794 h1.42
Mechanical 16:
  drawing of 400 lines, arcs and shapes, not listed

## SSW-150-02-S-D-RA [mil]
pads (100):
  oct 59.06x59.06 hole 39.37: 1(-2450,60) 2(-2450,160) 3(-2350,60) 4(-2350,160) 5(-2250,60) 6(-2250,160) 7(-2150,60) 8(-2150,160) 9(-2050,60) 10(-2050,160) 11(-1950,60) 12(-1950,160) 13(-1850,60) 14(-1850,160) 15(-1750,60) 16(-1750,160) 17(-1650,60) 18(-1650,160) 19(-1550,60) 20(-1550,160) 21(-1450,60) 22(-1450,160) 23(-1350,60) 24(-1350,160) 25(-1250,60) 26(-1250,160) 27(-1150,60) 28(-1150,160) 29(-1050,60) 30(-1050,160) 31(-950,60) 32(-950,160) 33(-850,60) 34(-850,160) 35(-750,60) 36(-750,160) 37(-650,60) 38(-650,160) 39(-550,60) 40(-550,160) 41(-450,60) 42(-450,160) 43(-350,60) 44(-350,160) 45(-250,60) 46(-250,160) 47(-150,60) 48(-150,160) 49(-50,60) 50(-50,160) 51(50,60) 52(50,160) 53(150,60) 54(150,160) 55(250,60) 56(250,160) 57(350,60) 58(350,160) 59(450,60) 60(450,160) 61(550,60) 62(550,160) 63(650,60) 64(650,160) 65(750,60) 66(750,160) 67(850,60) 68(850,160) 69(950,60) 70(950,160) 71(1050,60) 72(1050,160) 73(1150,60) 74(1150,160) 75(1250,60) 76(1250,160) 77(1350,60) 78(1350,160) 79(1450,60) 80(1450,160) 81(1550,60) 82(1550,160) 83(1650,60) 84(1650,160) 85(1750,60) 86(1750,160) 87(1850,60) 88(1850,160) 89(1950,60) 90(1950,160) 91(2050,60) 92(2050,160) 93(2150,60) 94(2150,160) 95(2250,60) 96(2250,160) 97(2350,60) 98(2350,160) 99(2450,60) 100(2450,160)
Top Overlay:
  lines w8: -2505.08,-330.55 2505.08,-330.55 2505.08,-4.17 -2505.08,-4.17 -2505.08,-330.55
  text "1" at -2473.43,-301.18 h56.1
  text "100" at 2300,-100 h56.1
  text "99" at 2350,-300 h56.1
  text "2" at -2476.38,-86.61 h56.1
Mechanical 16:
  rectangle: -2460,0 -2440,170
  rectangle: -2360,0 -2340,170
  rectangle: -2260,0 -2240,170
  rectangle: -2160,0 -2140,170
  rectangle: -2060,0 -2040,170
  rectangle: -1960,0 -1940,170
  rectangle: -1860,0 -1840,170
  rectangle: -1760,0 -1740,170
  rectangle: -1660,0 -1640,170
  rectangle: -1560,0 -1540,170
  rectangle: -1460,0 -1440,170
  rectangle: -1360,0 -1340,170
  rectangle: -1260,0 -1240,170
  rectangle: -1160,0 -1140,170
  rectangle: -1060,0 -1040,170
  rectangle: -960,0 -940,170
  rectangle: -860,0 -840,170
  rectangle: -760,0 -740,170
  rectangle: -660,0 -640,170
  rectangle: -560,0 -540,170
  rectangle: -460,0 -440,170
  rectangle: -360,0 -340,170
  rectangle: -260,0 -240,170
  rectangle: -160,0 -140,170
  rectangle: -60,0 -40,170
  rectangle: 40,0 60,170
  rectangle: 140,0 160,170
  rectangle: 240,0 260,170
  rectangle: 340,0 360,170
  rectangle: 440,0 460,170
  rectangle: 540,0 560,170
  rectangle: 640,0 660,170
  rectangle: 740,0 760,170
  rectangle: 840,0 860,170
  rectangle: 940,0 960,170
  rectangle: 1040,0 1060,170
  rectangle: 1140,0 1160,170
  rectangle: 1240,0 1260,170
  rectangle: 1340,0 1360,170
  rectangle: 1440,0 1460,170
  rectangle: 1540,0 1560,170
  rectangle: 1640,0 1660,170
  rectangle: 1740,0 1760,170
  rectangle: 1840,0 1860,170
  rectangle: 1940,0 1960,170
  rectangle: 2040,0 2060,170
  rectangle: 2140,0 2160,170
  rectangle: 2240,0 2260,170
  rectangle: 2340,0 2360,170
  rectangle: 2440,0 2460,170

## SSW-150-02-S-Q [mm]
pads (100):
  oct 1.5x1.5 hole 1: 1(-62.23,-2.54) 2(-62.23,2.54) 3(-59.69,-2.54) 4(-59.69,2.54) 5(-57.15,-2.54) 6(-57.15,2.54) 7(-54.61,-2.54) 8(-54.61,2.54) 9(-52.07,-2.54) 10(-52.07,2.54) 11(-49.53,-2.54) 12(-49.53,2.54) 13(-46.99,-2.54) 14(-46.99,2.54) 15(-44.45,-2.54) 16(-44.45,2.54) 17(-41.91,-2.54) 18(-41.91,2.54) 19(-39.37,-2.54) 20(-39.37,2.54) 21(-36.83,-2.54) 22(-36.83,2.54) 23(-34.29,-2.54) 24(-34.29,2.54) 25(-31.75,-2.54) 26(-31.75,2.54) 27(-29.21,-2.54) 28(-29.21,2.54) 29(-26.67,-2.54) 30(-26.67,2.54) 31(-24.13,-2.54) 32(-24.13,2.54) 33(-21.59,-2.54) 34(-21.59,2.54) 35(-19.05,-2.54) 36(-19.05,2.54) 37(-16.51,-2.54) 38(-16.51,2.54) 39(-13.97,-2.54) 40(-13.97,2.54) 41(-11.43,-2.54) 42(-11.43,2.54) 43(-8.89,-2.54) 44(-8.89,2.54) 45(-6.35,-2.54) 46(-6.35,2.54) 47(-3.81,-2.54) 48(-3.81,2.54) 49(-1.27,-2.54) 50(-1.27,2.54) 51(1.27,-2.54) 52(1.27,2.54) 53(3.81,-2.54) 54(3.81,2.54) 55(6.35,-2.54) 56(6.35,2.54) 57(8.89,-2.54) 58(8.89,2.54) 59(11.43,-2.54) 60(11.43,2.54) 61(13.97,-2.54) 62(13.97,2.54) 63(16.51,-2.54) 64(16.51,2.54) 65(19.05,-2.54) 66(19.05,2.54) 67(21.59,-2.54) 68(21.59,2.54) 69(24.13,-2.54) 70(24.13,2.54) 71(26.67,-2.54) 72(26.67,2.54) 73(29.21,-2.54) 74(29.21,2.54) 75(31.75,-2.54) 76(31.75,2.54) 77(34.29,-2.54) 78(34.29,2.54) 79(36.83,-2.54) 80(36.83,2.54) 81(39.37,-2.54) 82(39.37,2.54) 83(41.91,-2.54) 84(41.91,2.54) 85(44.45,-2.54) 86(44.45,2.54) 87(46.99,-2.54) 88(46.99,2.54) 89(49.53,-2.54) 90(49.53,2.54) 91(52.07,-2.54) 92(52.07,2.54) 93(54.61,-2.54) 94(54.61,2.54) 95(57.15,-2.54) 96(57.15,2.54) 97(59.69,-2.54) 98(59.69,2.54) 99(62.23,-2.54) 100(62.23,2.54)
Top Overlay:
  lines w0.203: -63.629,-3.695 63.629,-3.695 63.629,3.695 -63.629,3.695 -63.629,-3.695
  text "1" at -62.738,-5.588 h1.42
  text "2" at -62.738,4.064 h1.42
  text "99" at 60.96,-5.588 h1.42
  text "100" at 59.436,4.064 h1.42
Mechanical 16:
  drawing of 400 lines, arcs and shapes, not listed